# Altium footprint library smd-ipc.PCBLIB: 363 footprints (part 26 of 27) (continued)
## SQFP-S-44X44-568 [mm] (continued)
Top Overlay:
  circle w0.254: c-19.7,-20.2 r0.75
  lines w0.203: -21.77,-21.76 21.76,-21.76 21.76,21.76 -21.77,21.76 -21.77,-21.76
Mechanical 16:
  drawing of 572 lines, arcs and shapes, not listed
Mechanical 27:
  lines w0.2: -24.4,-24.4 -24.4,24.4 24.4,24.4 24.4,-24.4 -24.4,-24.4

## SQFP-S-44X44-576 [mm]
pads (576):
  rect 0.17x1.6 smd: 1(-21.45,-22.6) 2(-21.15,-22.6) 3(-20.85,-22.6) 4(-20.55,-22.6) 5(-20.25,-22.6) 6(-19.95,-22.6) 7(-19.65,-22.6) 8(-19.35,-22.6) 9(-19.05,-22.6) 10(-18.75,-22.6) 11(-18.45,-22.6) 12(-18.15,-22.6) 13(-17.85,-22.6) 14(-17.55,-22.6) 15(-17.25,-22.6) 16(-16.95,-22.6) 17(-16.65,-22.6) 18(-16.35,-22.6) 19(-16.05,-22.6) 20(-15.75,-22.6) 21(-15.45,-22.6) 22(-15.15,-22.6) 23(-14.85,-22.6) 24(-14.55,-22.6) 25(-14.25,-22.6) 26(-13.95,-22.6) 27(-13.65,-22.6) 28(-13.35,-22.6) 29(-13.05,-22.6) 30(-12.75,-22.6) 31(-12.45,-22.6) 32(-12.15,-22.6) 33(-11.85,-22.6) 34(-11.55,-22.6) 35(-11.25,-22.6) 36(-10.95,-22.6) 37(-10.65,-22.6) 38(-10.35,-22.6) 39(-10.05,-22.6) 40(-9.75,-22.6) 41(-9.45,-22.6) 42(-9.15,-22.6) 43(-8.85,-22.6) 44(-8.55,-22.6) 45(-8.25,-22.6) 46(-7.95,-22.6) 47(-7.65,-22.6) 48(-7.35,-22.6) 49(-7.05,-22.6) 50(-6.75,-22.6) 51(-6.45,-22.6) 52(-6.15,-22.6) 53(-5.85,-22.6) 54(-5.55,-22.6) 55(-5.25,-22.6) 56(-4.95,-22.6) 57(-4.65,-22.6) 58(-4.35,-22.6) 59(-4.05,-22.6) 60(-3.75,-22.6) 61(-3.45,-22.6) 62(-3.15,-22.6) 63(-2.85,-22.6) 64(-2.55,-22.6) 65(-2.25,-22.6) 66(-1.95,-22.6) 67(-1.65,-22.6) 68(-1.35,-22.6) 69(-1.05,-22.6) 70(-0.75,-22.6) 71(-0.45,-22.6) 72(-0.15,-22.6) 73(0.15,-22.6) 74(0.45,-22.6) 75(0.75,-22.6) 76(1.05,-22.6) 77(1.35,-22.6) 78(1.65,-22.6) 79(1.95,-22.6) 80(2.25,-22.6) 81(2.55,-22.6) 82(2.85,-22.6) 83(3.15,-22.6) 84(3.45,-22.6) 85(3.75,-22.6) 86(4.05,-22.6) 87(4.35,-22.6) 88(4.65,-22.6) 89(4.95,-22.6) 90(5.25,-22.6) 91(5.55,-22.6) 92(5.85,-22.6) 93(6.15,-22.6) 94(6.45,-22.6) 95(6.75,-22.6) 96(7.05,-22.6) 97(7.35,-22.6) 98(7.65,-22.6) 99(7.95,-22.6) 100(8.25,-22.6) 101(8.55,-22.6) 102(8.85,-22.6) 103(9.15,-22.6) 104(9.45,-22.6) 105(9.75,-22.6) 106(10.05,-22.6) 107(10.35,-22.6) 108(10.65,-22.6) 109(10.95,-22.6) 110(11.25,-22.6) 111(11.55,-22.6) 112(11.85,-22.6) 113(12.15,-22.6) 114(12.45,-22.6) 115(12.75,-22.6) 116(13.05,-22.6) 117(13.35,-22.6) 118(13.65,-22.6) 119(13.95,-22.6) 120(14.25,-22.6) 121(14.55,-22.6) 122(14.85,-22.6) 123(15.15,-22.6) 124(15.45,-22.6) 125(15.75,-22.6) 126(16.05,-22.6) 127(16.35,-22.6) 128(16.65,-22.6) 129(16.95,-22.6) 130(17.25,-22.6) 131(17.55,-22.6) 132(17.85,-22.6) 133(18.15,-22.6) 134(18.45,-22.6) 135(18.75,-22.6) 136(19.05,-22.6) 137(19.35,-22.6) 138(19.65,-22.6) 139(19.95,-22.6) 140(20.25,-22.6) 141(20.55,-22.6) 142(20.85,-22.6) 143(21.15,-22.6) 144(21.45,-22.6) 289(21.45,22.6) 290(21.15,22.6) 291(20.85,22.6) 292(20.55,22.6) 293(20.25,22.6) 294(19.95,22.6) 295(19.65,22.6) 296(19.35,22.6) 297(19.05,22.6) 298(18.75,22.6) 299(18.45,22.6) 300(18.15,22.6) 301(17.85,22.6) 302(17.55,22.6) 303(17.25,22.6) 304(16.95,22.6) 305(16.65,22.6) 306(16.35,22.6) 307(16.05,22.6) 308(15.75,22.6) 309(15.45,22.6) 310(15.15,22.6) 311(14.85,22.6) 312(14.55,22.6) 313(14.25,22.6) 314(13.95,22.6) 315(13.65,22.6) 316(13.35,22.6) 317(13.05,22.6) 318(12.75,22.6) 319(12.45,22.6) 320(12.15,22.6) 321(11.85,22.6) 322(11.55,22.6) 323(11.25,22.6) 324(10.95,22.6) 325(10.65,22.6) 326(10.35,22.6) 327(10.05,22.6) 328(9.75,22.6) 329(9.45,22.6) 330(9.15,22.6) 331(8.85,22.6) 332(8.55,22.6) 333(8.25,22.6) 334(7.95,22.6) 335(7.65,22.6) 336(7.35,22.6) 337(7.05,22.6) 338(6.75,22.6) 339(6.45,22.6) 340(6.15,22.6) 341(5.85,22.6) 342(5.55,22.6) 343(5.25,22.6) 344(4.95,22.6) 345(4.65,22.6) 346(4.35,22.6) 347(4.05,22.6) 348(3.75,22.6) 349(3.45,22.6) 350(3.15,22.6) 351(2.85,22.6) 352(2.55,22.6) 353(2.25,22.6) 354(1.95,22.6) 355(1.65,22.6) 356(1.35,22.6) 357(1.05,22.6) 358(0.75,22.6) 359(0.45,22.6) 360(0.15,22.6) 361(-0.15,22.6) 362(-0.45,22.6) 363(-0.75,22.6) 364(-1.05,22.6) 365(-1.35,22.6) 366(-1.65,22.6) 367(-1.95,22.6) 368(-2.25,22.6) 369(-2.55,22.6) 370(-2.85,22.6) 371(-3.15,22.6) 372(-3.45,22.6) 373(-3.75,22.6) 374(-4.05,22.6) 375(-4.35,22.6) 376(-4.65,22.6) 377(-4.95,22.6) 378(-5.25,22.6) 379(-5.55,22.6) 380(-5.85,22.6) 381(-6.15,22.6) 382(-6.45,22.6) 383(-6.75,22.6) 384(-7.05,22.6) 385(-7.35,22.6) 386(-7.65,22.6) 387(-7.95,22.6) 388(-8.25,22.6) 389(-8.55,22.6) 390(-8.85,22.6) 391(-9.15,22.6) 392(-9.45,22.6) 393(-9.75,22.6) 394(-10.05,22.6) 395(-10.35,22.6) 396(-10.65,22.6) 397(-10.95,22.6) 398(-11.25,22.6) 399(-11.55,22.6) 400(-11.85,22.6) 401(-12.15,22.6) 402(-12.45,22.6) 403(-12.75,22.6) 404(-13.05,22.6) 405(-13.35,22.6) 406(-13.65,22.6) 407(-13.95,22.6) 408(-14.25,22.6) 409(-14.55,22.6) 410(-14.85,22.6) 411(-15.15,22.6) 412(-15.45,22.6) 413(-15.75,22.6) 414(-16.05,22.6) 415(-16.35,22.6) 416(-16.65,22.6) 417(-16.95,22.6) 418(-17.25,22.6) 419(-17.55,22.6) 420(-17.85,22.6) 421(-18.15,22.6) 422(-18.45,22.6) 423(-18.75,22.6) 424(-19.05,22.6) 425(-19.35,22.6) 426(-19.65,22.6) 427(-19.95,22.6) 428(-20.25,22.6) 429(-20.55,22.6) 430(-20.85,22.6) 431(-21.15,22.6) 432(-21.45,22.6)
  rect 1.6x0.17 smd: 145(22.6,-21.45) 146(22.6,-21.15) 147(22.6,-20.85) 148(22.6,-20.55) 149(22.6,-20.25) 150(22.6,-19.95) 151(22.6,-19.65) 152(22.6,-19.35) 153(22.6,-19.05) 154(22.6,-18.75) 155(22.6,-18.45) 156(22.6,-18.15) 157(22.6,-17.85) 158(22.6,-17.55) 159(22.6,-17.25) 160(22.6,-16.95) 161(22.6,-16.65) 162(22.6,-16.35) 163(22.6,-16.05) 164(22.6,-15.75) 165(22.6,-15.45) 166(22.6,-15.15) 167(22.6,-14.85) 168(22.6,-14.55) 169(22.6,-14.25) 170(22.6,-13.95) 171(22.6,-13.65) 172(22.6,-13.35) 173(22.6,-13.05) 174(22.6,-12.75) 175(22.6,-12.45) 176(22.6,-12.15) 177(22.6,-11.85) 178(22.6,-11.55) 179(22.6,-11.25) 180(22.6,-10.95) 181(22.6,-10.65) 182(22.6,-10.35) 183(22.6,-10.05) 184(22.6,-9.75) 185(22.6,-9.45) 186(22.6,-9.15) 187(22.6,-8.85) 188(22.6,-8.55) 189(22.6,-8.25) 190(22.6,-7.95) 191(22.6,-7.65) 192(22.6,-7.35) 193(22.6,-7.05) 194(22.6,-6.75) 195(22.6,-6.45) 196(22.6,-6.15) 197(22.6,-5.85) 198(22.6,-5.55) 199(22.6,-5.25) 200(22.6,-4.95) 201(22.6,-4.65) 202(22.6,-4.35) 203(22.6,-4.05) 204(22.6,-3.75) 205(22.6,-3.45) 206(22.6,-3.15) 207(22.6,-2.85) 208(22.6,-2.55) 209(22.6,-2.25) 210(22.6,-1.95) 211(22.6,-1.65) 212(22.6,-1.35) 213(22.6,-1.05) 214(22.6,-0.75) 215(22.6,-0.45) 216(22.6,-0.15) 217(22.6,0.15) 218(22.6,0.45) 219(22.6,0.75) 220(22.6,1.05) 221(22.6,1.35) 222(22.6,1.65) 223(22.6,1.95) 224(22.6,2.25) 225(22.6,2.55) 226(22.6,2.85) 227(22.6,3.15) 228(22.6,3.45) 229(22.6,3.75) 230(22.6,4.05) 231(22.6,4.35) 232(22.6,4.65) 233(22.6,4.95) 234(22.6,5.25) 235(22.6,5.55) 236(22.6,5.85) 237(22.6,6.15) 238(22.6,6.45) 239(22.6,6.75) 240(22.6,7.05) 241(22.6,7.35) 242(22.6,7.65) 243(22.6,7.95) 244(22.6,8.25) 245(22.6,8.55) 246(22.6,8.85) 247(22.6,9.15) 248(22.6,9.45) 249(22.6,9.75) 250(22.6,10.05) 251(22.6,10.35) 252(22.6,10.65) 253(22.6,10.95) 254(22.6,11.25) 255(22.6,11.55) 256(22.6,11.85) 257(22.6,12.15) 258(22.6,12.45) 259(22.6,12.75) 260(22.6,13.05) 261(22.6,13.35) 262(22.6,13.65) 263(22.6,13.95) 264(22.6,14.25) 265(22.6,14.55) 266(22.6,14.85) 267(22.6,15.15) 268(22.6,15.45) 269(22.6,15.75) 270(22.6,16.05) 271(22.6,16.35) 272(22.6,16.65) 273(22.6,16.95) 274(22.6,17.25) 275(22.6,17.55) 276(22.6,17.85) 277(22.6,18.15) 278(22.6,18.45) 279(22.6,18.75) 280(22.6,19.05) 281(22.6,19.35) 282(22.6,19.65) 283(22.6,19.95) 284(22.6,20.25) 285(22.6,20.55) 286(22.6,20.85) 287(22.6,21.15) 288(22.6,21.45) 433(-22.6,21.45) 434(-22.6,21.15) 435(-22.6,20.85) 436(-22.6,20.55) 437(-22.6,20.25) 438(-22.6,19.95) 439(-22.6,19.65) 440(-22.6,19.35) 441(-22.6,19.05) 442(-22.6,18.75) 443(-22.6,18.45) 444(-22.6,18.15) 445(-22.6,17.85) 446(-22.6,17.55) 447(-22.6,17.25) 448(-22.6,16.95) 449(-22.6,16.65) 450(-22.6,16.35) 451(-22.6,16.05) 452(-22.6,15.75) 453(-22.6,15.45) 454(-22.6,15.15) 455(-22.6,14.85) 456(-22.6,14.55) 457(-22.6,14.25) 458(-22.6,13.95) 459(-22.6,13.65) 460(-22.6,13.35) 461(-22.6,13.05) 462(-22.6,12.75) 463(-22.6,12.45) 464(-22.6,12.15) 465(-22.6,11.85) 466(-22.6,11.55) 467(-22.6,11.25) 468(-22.6,10.95) 469(-22.6,10.65) 470(-22.6,10.35) 471(-22.6,10.05) 472(-22.6,9.75) 473(-22.6,9.45) 474(-22.6,9.15) 475(-22.6,8.85) 476(-22.6,8.55) 477(-22.6,8.25) 478(-22.6,7.95) 479(-22.6,7.65) 480(-22.6,7.35) 481(-22.6,7.05) 482(-22.6,6.75) 483(-22.6,6.45) 484(-22.6,6.15) 485(-22.6,5.85) 486(-22.6,5.55) 487(-22.6,5.25) 488(-22.6,4.95) 489(-22.6,4.65) 490(-22.6,4.35) 491(-22.6,4.05) 492(-22.6,3.75) 493(-22.6,3.45) 494(-22.6,3.15) 495(-22.6,2.85) 496(-22.6,2.55) 497(-22.6,2.25) 498(-22.6,1.95) 499(-22.6,1.65) 500(-22.6,1.35) 501(-22.6,1.05) 502(-22.6,0.75) 503(-22.6,0.45) 504(-22.6,0.15) 505(-22.6,-0.15) 506(-22.6,-0.45) 507(-22.6,-0.75) 508(-22.6,-1.05) 509(-22.6,-1.35) 510(-22.6,-1.65) 511(-22.6,-1.95) 512(-22.6,-2.25) 513(-22.6,-2.55) 514(-22.6,-2.85) 515(-22.6,-3.15) 516(-22.6,-3.45) 517(-22.6,-3.75) 518(-22.6,-4.05) 519(-22.6,-4.35) 520(-22.6,-4.65) 521(-22.6,-4.95) 522(-22.6,-5.25) 523(-22.6,-5.55) 524(-22.6,-5.85) 525(-22.6,-6.15) 526(-22.6,-6.45) 527(-22.6,-6.75) 528(-22.6,-7.05) 529(-22.6,-7.35) 530(-22.6,-7.65) 531(-22.6,-7.95) 532(-22.6,-8.25) 533(-22.6,-8.55) 534(-22.6,-8.85) 535(-22.6,-9.15) 536(-22.6,-9.45) 537(-22.6,-9.75) 538(-22.6,-10.05) 539(-22.6,-10.35) 540(-22.6,-10.65) 541(-22.6,-10.95) 542(-22.6,-11.25) 543(-22.6,-11.55) 544(-22.6,-11.85) 545(-22.6,-12.15) 546(-22.6,-12.45) 547(-22.6,-12.75) 548(-22.6,-13.05) 549(-22.6,-13.35) 550(-22.6,-13.65) 551(-22.6,-13.95) 552(-22.6,-14.25) 553(-22.6,-14.55) 554(-22.6,-14.85) 555(-22.6,-15.15) 556(-22.6,-15.45) 557(-22.6,-15.75) 558(-22.6,-16.05) 559(-22.6,-16.35) 560(-22.6,-16.65) 561(-22.6,-16.95) 562(-22.6,-17.25) 563(-22.6,-17.55) 564(-22.6,-17.85) 565(-22.6,-18.15) 566(-22.6,-18.45) 567(-22.6,-18.75) 568(-22.6,-19.05) 569(-22.6,-19.35) 570(-22.6,-19.65) 571(-22.6,-19.95) 572(-22.6,-20.25) 573(-22.6,-20.55) 574(-22.6,-20.85) 575(-22.6,-21.15) 576(-22.6,-21.45)
Top Overlay:
  circle w0.254: c-19.7,-20.2 r0.75
  lines w0.203: -21.77,-21.76 21.76,-21.76 21.76,21.76 -21.77,21.76 -21.77,-21.76
Mechanical 16:
  drawing of 580 lines, arcs and shapes, not listed
Mechanical 27:
  lines w0.2: -24.4,-24.4 -24.4,24.4 24.4,24.4 24.4,-24.4 -24.4,-24.4

## SSO48 [mm]
pads (48):
  rect 0.4x2.2 smd: 1(-7.303,-4.7) 2(-6.668,-4.7) 3(-6.033,-4.7) 4(-5.398,-4.7) 5(-4.763,-4.7) 6(-4.128,-4.7) 7(-3.493,-4.7) 8(-2.858,-4.7) 9(-2.223,-4.7) 10(-1.588,-4.7) 11(-0.953,-4.7) 12(-0.318,-4.7) 13(0.318,-4.7) 14(0.953,-4.7) 15(1.588,-4.7) 16(2.223,-4.7) 17(2.858,-4.7) 18(3.493,-4.7) 19(4.128,-4.7) 20(4.763,-4.7) 21(5.398,-4.7) 22(6.033,-4.7) 23(6.668,-4.7) 24(7.303,-4.7) 25(7.303,4.7) 26(6.668,4.7) 27(6.033,4.7) 28(5.398,4.7) 29(4.763,4.7) 30(4.128,4.7) 31(3.493,4.7) 32(2.858,4.7) 33(2.223,4.7) 34(1.588,4.7) 35(0.953,4.7) 36(0.318,4.7) 37(-0.318,4.7) 38(-0.953,4.7) 39(-1.588,4.7) 40(-2.223,4.7) 41(-2.858,4.7) 42(-3.493,4.7) 43(-4.128,4.7) 44(-4.763,4.7) 45(-5.398,4.7) 46(-6.033,4.7) 47(-6.668,4.7) 48(-7.303,4.7)
Mechanical 16:
  rectangle: -7.453,-5.33 -7.152,-3.8
  rectangle: -6.818,-5.33 -6.517,-3.8
  rectangle: -6.183,-5.33 -5.882,-3.8
  rectangle: -5.548,-5.33 -5.247,-3.8
  rectangle: -4.913,-5.33 -4.612,-3.8
  rectangle: -4.278,-5.33 -3.977,-3.8
  rectangle: -3.643,-5.33 -3.342,-3.8
  rectangle: -3.008,-5.33 -2.707,-3.8
  rectangle: -2.373,-5.33 -2.072,-3.8
  rectangle: -1.738,-5.33 -1.437,-3.8
  rectangle: -1.103,-5.33 -0.802,-3.8
  rectangle: -0.468,-5.33 -0.167,-3.8
  rectangle: 0.167,-5.33 0.468,-3.8
  rectangle: 0.802,-5.33 1.103,-3.8
  rectangle: 1.437,-5.33 1.738,-3.8
  rectangle: 2.072,-5.33 2.373,-3.8
  rectangle: 2.707,-5.33 3.008,-3.8
  rectangle: 3.342,-5.33 3.643,-3.8
  rectangle: 3.977,-5.33 4.278,-3.8
  rectangle: 4.612,-5.33 4.913,-3.8
  rectangle: 5.247,-5.33 5.548,-3.8
  rectangle: 5.882,-5.33 6.183,-3.8
  rectangle: 6.517,-5.33 6.818,-3.8
  rectangle: 7.152,-5.33 7.453,-3.8
  rectangle: 7.152,3.8 7.453,5.33
  rectangle: 6.517,3.8 6.818,5.33
  rectangle: 5.882,3.8 6.183,5.33
  rectangle: 5.247,3.8 5.548,5.33
  rectangle: 4.612,3.8 4.913,5.33
  rectangle: 3.977,3.8 4.278,5.33
  rectangle: 3.342,3.8 3.643,5.33
  rectangle: 2.707,3.8 3.008,5.33
  rectangle: 2.072,3.8 2.373,5.33
  rectangle: 1.437,3.8 1.738,5.33
  rectangle: 0.802,3.8 1.103,5.33
  rectangle: 0.167,3.8 0.468,5.33
  rectangle: -0.468,3.8 -0.167,5.33
  rectangle: -1.103,3.8 -0.802,5.33
  rectangle: -1.738,3.8 -1.437,5.33
  rectangle: -2.373,3.8 -2.072,5.33
  rectangle: -3.008,3.8 -2.707,5.33
  rectangle: -3.643,3.8 -3.342,5.33
  rectangle: -4.278,3.8 -3.977,5.33
  rectangle: -4.913,3.8 -4.612,5.33
  rectangle: -5.548,3.8 -5.247,5.33
  rectangle: -6.183,3.8 -5.882,5.33
  rectangle: -6.818,3.8 -6.517,5.33
  rectangle: -7.453,3.8 -7.152,5.33
  lines w0.203: -7.9,-3.2 -7.9,-3.7 7.9,-3.7 7.9,-3.2 ; -7.9,-3.2 -7.9,3.7 7.9,3.7 7.9,-3.2 ; -7.9,-3.2 7.9,-3.2
Mechanical 27:
  lines w0.2: -8.395,-5.9 8.395,-5.9 8.395,5.9 -8.395,5.9 -8.395,-5.9

## SSO56 [mm]
pads (56):
  rect 0.4x2.2 smd: 1(-8.573,-4.7) 2(-7.938,-4.7) 3(-7.303,-4.7) 4(-6.668,-4.7) 5(-6.033,-4.7) 6(-5.398,-4.7) 7(-4.763,-4.7) 8(-4.128,-4.7) 9(-3.493,-4.7) 10(-2.858,-4.7) 11(-2.223,-4.7) 12(-1.588,-4.7) 13(-0.953,-4.7) 14(-0.318,-4.7) 15(0.318,-4.7) 16(0.953,-4.7) 17(1.588,-4.7) 18(2.223,-4.7) 19(2.858,-4.7) 20(3.493,-4.7) 21(4.128,-4.7) 22(4.763,-4.7) 23(5.398,-4.7) 24(6.033,-4.7) 25(6.668,-4.7) 26(7.303,-4.7) 27(7.938,-4.7) 28(8.573,-4.7) 29(8.573,4.7) 30(7.938,4.7) 31(7.303,4.7) 32(6.668,4.7) 33(6.033,4.7) 34(5.398,4.7) 35(4.763,4.7) 36(4.128,4.7) 37(3.493,4.7) 38(2.858,4.7) 39(2.223,4.7) 40(1.588,4.7) 41(0.953,4.7) 42(0.318,4.7) 43(-0.318,4.7) 44(-0.953,4.7) 45(-1.588,4.7) 46(-2.223,4.7) 47(-2.858,4.7) 48(-3.493,4.7) 49(-4.128,4.7) 50(-4.763,4.7) 51(-5.398,4.7) 52(-6.033,4.7) 53(-6.668,4.7) 54(-7.303,4.7) 55(-7.938,4.7) 56(-8.573,4.7)
Mechanical 16:
  rectangle: -8.723,-5.33 -8.422,-3.8
  rectangle: -8.088,-5.33 -7.787,-3.8
  rectangle: -7.453,-5.33 -7.152,-3.8
  rectangle: -6.818,-5.33 -6.517,-3.8
  rectangle: -6.183,-5.33 -5.882,-3.8
  rectangle: -5.548,-5.33 -5.247,-3.8
  rectangle: -4.913,-5.33 -4.612,-3.8
  rectangle: -4.278,-5.33 -3.977,-3.8
  rectangle: -3.643,-5.33 -3.342,-3.8
  rectangle: -3.008,-5.33 -2.707,-3.8
  rectangle: -2.373,-5.33 -2.072,-3.8
  rectangle: -1.738,-5.33 -1.437,-3.8
  rectangle: -1.103,-5.33 -0.802,-3.8
  rectangle: -0.468,-5.33 -0.167,-3.8
  rectangle: 0.167,-5.33 0.468,-3.8
  rectangle: 0.802,-5.33 1.103,-3.8
  rectangle: 1.437,-5.33 1.738,-3.8
  rectangle: 2.072,-5.33 2.373,-3.8
  rectangle: 2.707,-5.33 3.008,-3.8
  rectangle: 3.342,-5.33 3.643,-3.8
  rectangle: 3.977,-5.33 4.278,-3.8
  rectangle: 4.612,-5.33 4.913,-3.8
  rectangle: 5.247,-5.33 5.548,-3.8
  rectangle: 5.882,-5.33 6.183,-3.8
  rectangle: 6.517,-5.33 6.818,-3.8
  rectangle: 7.152,-5.33 7.453,-3.8
  rectangle: 7.787,-5.33 8.088,-3.8
  rectangle: 8.422,-5.33 8.723,-3.8
  rectangle: 8.422,3.8 8.723,5.33
  rectangle: 7.787,3.8 8.088,5.33
  rectangle: 7.152,3.8 7.453,5.33
  rectangle: 6.517,3.8 6.818,5.33
  rectangle: 5.882,3.8 6.183,5.33
  rectangle: 5.247,3.8 5.548,5.33
  rectangle: 4.612,3.8 4.913,5.33
  rectangle: 3.977,3.8 4.278,5.33
  rectangle: 3.342,3.8 3.643,5.33
  rectangle: 2.707,3.8 3.008,5.33
  rectangle: 2.072,3.8 2.373,5.33
  rectangle: 1.437,3.8 1.738,5.33
  rectangle: 0.802,3.8 1.103,5.33
  rectangle: 0.167,3.8 0.468,5.33
  rectangle: -0.468,3.8 -0.167,5.33
  rectangle: -1.103,3.8 -0.802,5.33
  rectangle: -1.738,3.8 -1.437,5.33
  rectangle: -2.373,3.8 -2.072,5.33
  rectangle: -3.008,3.8 -2.707,5.33
  rectangle: -3.643,3.8 -3.342,5.33
  rectangle: -4.278,3.8 -3.977,5.33
  rectangle: -4.913,3.8 -4.612,5.33
  rectangle: -5.548,3.8 -5.247,5.33
  rectangle: -6.183,3.8 -5.882,5.33
  rectangle: -6.818,3.8 -6.517,5.33
  rectangle: -7.453,3.8 -7.152,5.33
  rectangle: -8.088,3.8 -7.787,5.33
  rectangle: -8.723,3.8 -8.422,5.33
  lines w0.203: -9.17,-3.2 -9.17,-3.7 9.17,-3.7 9.17,-3.2 ; -9.17,-3.2 -9.17,3.7 9.17,3.7 9.17,-3.2 ; -9.17,-3.2 9.17,-3.2
Mechanical 27:
  lines w0.2: -9.395,-5.9 9.395,-5.9 9.395,5.9 -9.395,5.9 -9.395,-5.9

## SSO64 [mm]
pads (64):
  rect 0.5x2 smd: 1(-12.4,-6.7) 2(-11.6,-6.7) 3(-10.8,-6.7) 4(-10,-6.7) 5(-9.2,-6.7) 6(-8.4,-6.7) 7(-7.6,-6.7) 8(-6.8,-6.7) 9(-6,-6.7) 10(-5.2,-6.7) 11(-4.4,-6.7) 12(-3.6,-6.7) 13(-2.8,-6.7) 14(-2,-6.7) 15(-1.2,-6.7) 16(-0.4,-6.7) 17(0.4,-6.7) 18(1.2,-6.7) 19(2,-6.7) 20(2.8,-6.7) 21(3.6,-6.7) 22(4.4,-6.7) 23(5.2,-6.7) 24(6,-6.7) 25(6.8,-6.7) 26(7.6,-6.7) 27(8.4,-6.7) 28(9.2,-6.7) 29(10,-6.7) 30(10.8,-6.7) 31(11.6,-6.7) 32(12.4,-6.7) 33(12.4,6.7) 34(11.6,6.7) 35(10.8,6.7) 36(10,6.7) 37(9.2,6.7) 38(8.4,6.7) 39(7.6,6.7) 40(6.8,6.7) 41(6,6.7) 42(5.2,6.7) 43(4.4,6.7) 44(3.6,6.7) 45(2.8,6.7) 46(2,6.7) 47(1.2,6.7) 48(0.4,6.7) 49(-0.4,6.7) 50(-1.2,6.7) 51(-2,6.7) 52(-2.8,6.7) 53(-3.6,6.7) 54(-4.4,6.7) 55(-5.2,6.7) 56(-6,6.7) 57(-6.8,6.7) 58(-7.6,6.7) 59(-8.4,6.7) 60(-9.2,6.7) 61(-10,6.7) 62(-10.8,6.7) 63(-11.6,6.7) 64(-12.4,6.7)
Mechanical 16:
  rectangle: -12.62,-7.25 -12.18,-6.05
  rectangle: -11.82,-7.25 -11.38,-6.05
  rectangle: -11.02,-7.25 -10.58,-6.05
  rectangle: -10.22,-7.25 -9.78,-6.05
  rectangle: -9.42,-7.25 -8.98,-6.05
  rectangle: -8.62,-7.25 -8.18,-6.05
  rectangle: -7.82,-7.25 -7.38,-6.05
  rectangle: -7.02,-7.25 -6.58,-6.05
  rectangle: -6.22,-7.25 -5.78,-6.05
  rectangle: -5.42,-7.25 -4.98,-6.05
  rectangle: -4.62,-7.25 -4.18,-6.05
  rectangle: -3.82,-7.25 -3.38,-6.05
  rectangle: -3.02,-7.25 -2.58,-6.05
  rectangle: -2.22,-7.25 -1.78,-6.05
  rectangle: -1.42,-7.25 -0.98,-6.05
  rectangle: -0.62,-7.25 -0.18,-6.05
  rectangle: 0.18,-7.25 0.62,-6.05
  rectangle: 0.98,-7.25 1.42,-6.05
  rectangle: 1.78,-7.25 2.22,-6.05
  rectangle: 2.58,-7.25 3.02,-6.05
  rectangle: 3.38,-7.25 3.82,-6.05
  rectangle: 4.18,-7.25 4.62,-6.05
  rectangle: 4.98,-7.25 5.42,-6.05
  rectangle: 5.78,-7.25 6.22,-6.05
  rectangle: 6.58,-7.25 7.02,-6.05
  rectangle: 7.38,-7.25 7.82,-6.05
  rectangle: 8.18,-7.25 8.62,-6.05
  rectangle: 8.98,-7.25 9.42,-6.05
  rectangle: 9.78,-7.25 10.22,-6.05
  rectangle: 10.58,-7.25 11.02,-6.05
  rectangle: 11.38,-7.25 11.82,-6.05
  rectangle: 12.18,-7.25 12.62,-6.05
  rectangle: 12.18,6.05 12.62,7.25
  rectangle: 11.38,6.05 11.82,7.25
  rectangle: 10.58,6.05 11.02,7.25
  rectangle: 9.78,6.05 10.22,7.25
  rectangle: 8.98,6.05 9.42,7.25
  rectangle: 8.18,6.05 8.62,7.25
  rectangle: 7.38,6.05 7.82,7.25
  rectangle: 6.58,6.05 7.02,7.25
  rectangle: 5.78,6.05 6.22,7.25
  rectangle: 4.98,6.05 5.42,7.25
  rectangle: 4.18,6.05 4.62,7.25
  rectangle: 3.38,6.05 3.82,7.25
  rectangle: 2.58,6.05 3.02,7.25
  rectangle: 1.78,6.05 2.22,7.25
  rectangle: 0.98,6.05 1.42,7.25
  rectangle: 0.18,6.05 0.62,7.25
  rectangle: -0.62,6.05 -0.18,7.25
  rectangle: -1.42,6.05 -0.98,7.25
  rectangle: -2.22,6.05 -1.78,7.25
  rectangle: -3.02,6.05 -2.58,7.25
  rectangle: -3.82,6.05 -3.38,7.25
  rectangle: -4.62,6.05 -4.18,7.25
  rectangle: -5.42,6.05 -4.98,7.25
  rectangle: -6.22,6.05 -5.78,7.25
  rectangle: -7.02,6.05 -6.58,7.25
  rectangle: -7.82,6.05 -7.38,7.25
  rectangle: -8.62,6.05 -8.18,7.25
  rectangle: -9.42,6.05 -8.98,7.25
  rectangle: -10.22,6.05 -9.78,7.25
  rectangle: -11.02,6.05 -10.58,7.25
  rectangle: -11.82,6.05 -11.38,7.25
  rectangle: -12.62,6.05 -12.18,7.25
  lines w0.203: -13.12,-5.06 -13.12,-5.96 13.12,-5.96 13.12,-5.06 ; -13.12,-5.06 -13.12,5.96 13.12,5.96 13.12,-5.06 ; -13.12,-5.06 13.12,-5.06
Mechanical 27:
  lines w0.2: -13.395,-7.9 13.395,-7.9 13.395,7.9 -13.395,7.9 -13.395,-7.9

## TO252 [mm]
pads (3):
  rect 1x1.6 smd: 1(-2.28,-4.8) 2(2.28,-4.8)
  rect 5.4x6.2 smd: 3(0,2.5)
Top Overlay:
  rectangle: -0.432,-3.023 0.432,-2.261
  lines w0.203: -3.277,3.835 -3.277,-2.159 3.277,-2.159 3.277,3.835
Mechanical 16:
  rectangle: -2.718,-5.156 -1.854,-2.261
  rectangle: 1.854,-5.156 2.718,-2.261
  region: 0,0 0.254,0 0.254,0.254 0,0.254
  lines w0.203: -3.277,3.835 3.277,3.835 ; -2.565,3.937 -2.565,4.648 -2.108,5.105 2.108,5.105 2.565,4.648 2.565,3.937 -2.565,3.937
Mechanical 27:
  lines w0.051: -3.973,-5.983 3.973,-5.983 3.973,5.983 -3.973,5.983 -3.973,-5.983

## TO263 [mm]
pads (3):
  rect 1x3.4 smd: 1(-2.54,-6.6) 2(2.54,-6.6)
  rect 6.8x9.6 smd: 3(0,3.5)
Top Overlay:
  rectangle: -0.432,-2.643 0.432,-1.881
  rectangle: -2.99,-4.74 -2.09,-1.94
  rectangle: 2.09,-4.74 2.99,-1.94
  lines w0.203: -4.917,7.165 -4.917,-1.839 4.917,-1.839 4.917,7.165
Mechanical 16:
  rectangle: -3,-7.5 -2.1,-4.7
  rectangle: 2.1,-7.5 3,-4.7
  region: 0,0 0.254,0 0.254,0.254 0,0.254
  lines w0.203: -4.917,7.165 4.917,7.165 ; -2.565,7.267 -2.565,7.678 -2.108,8.135 2.108,8.135 2.565,7.678 2.565,7.267 -2.565,7.267
Mechanical 27:
  lines w0.051: -5.973,-8.983 5.973,-8.983 5.973,8.983 -5.973,8.983 -5.973,-8.983

## TO268 [mm]
pads (3):
  rect 1.4x3.4 smd: 1(-5.45,-8.2) 2(5.45,-8.2)
  rect 13x13 smd: 3(0,3.2)
Top Overlay:
  rectangle: -0.72,-6.85 0.72,-5.55
  lines w0.203: -7.857,7.835 -7.857,-5.549 7.857,-5.549 7.857,7.835
Top Solder:
  rectangle: -7,-3.7 7,10.1
Mechanical 16:
  rectangle: -6.15,-9.55 -4.75,-6.85
  rectangle: -6.15,-6.85 -4.75,-5.55
  rectangle: 4.75,-6.85 6.15,-5.55
  rectangle: 4.75,-9.55 6.15,-6.85
  region: 0,0 0.254,0 0.254,0.254 0,0.254
  lines w0.203: -7.858,7.835 7.858,7.835 ; -6.565,7.937 -6.565,8.978 -6.108,9.436 6.108,9.436 6.565,8.978 6.565,7.937 -6.565,7.937
Mechanical 27:
  lines w0.051: -8.473,-10.483 8.473,-10.483 8.473,10.483 -8.473,10.483 -8.473,-10.483

## TS-003 [mm]
pads (3):
  rect 1x1.6 smd: 1(-2.28,-4.8) 2(2.28,-4.8)
  rect 5.4x6.2 smd: 3(0,2.5)
Top Overlay:
  rectangle: -0.432,-3.023 0.432,-2.261
  lines w0.203: -3.277,3.835 -3.277,-2.159 3.277,-2.159 3.277,3.835
Mechanical 16:
  rectangle: -2.718,-5.156 -1.854,-2.261
  rectangle: 1.854,-5.156 2.718,-2.261
  region: 0,0 0.254,0 0.254,0.254 0,0.254
  lines w0.203: -3.277,3.835 3.277,3.835 ; -2.565,3.937 -2.565,4.648 -2.108,5.105 2.108,5.105 2.565,4.648 2.565,3.937 -2.565,3.937
Mechanical 27:
  lines w0.051: -3.973,-5.983 3.973,-5.983 3.973,5.983 -3.973,5.983 -3.973,-5.983

## TS-005 [mm]
pads (3):
  rect 1x3.4 smd: 1(-2.54,-6.6) 2(2.54,-6.6)
  rect 6.8x9.6 smd: 3(0,3.5)
Top Overlay:
  rectangle: -0.432,-2.643 0.432,-1.881
  rectangle: -2.99,-4.74 -2.09,-1.94
  rectangle: 2.09,-4.74 2.99,-1.94
  lines w0.203: -4.917,7.165 -4.917,-1.839 4.917,-1.839 4.917,7.165
Mechanical 16:
  rectangle: -3,-7.5 -2.1,-4.7
  rectangle: 2.1,-7.5 3,-4.7
  region: 0,0 0.254,0 0.254,0.254 0,0.254
  lines w0.152: -4.917,7.165 4.917,7.165 ; 2.6,7.2 2.6,7.3 ; 2.6,7.3 2.6,7.7 2.2,8.1 -2.2,8.1 -2.6,7.7 -2.6,7.3 2.6,7.3
Mechanical 27:
  lines w0.051: -5.973,-8.983 5.973,-8.983 5.973,8.983 -5.973,8.983 -5.973,-8.983

## TSOP6X14 [mm]
pads (16):
  rect 0.4x1.6 smd: 1(-2.275,-6.6) 2(-1.625,-6.6) 3(-0.975,-6.6) 4(-0.325,-6.6) 5(0.325,-6.6) 6(0.975,-6.6) 7(1.625,-6.6) 8(2.275,-6.6) 9(2.275,6.6) 10(1.625,6.6) 11(0.975,6.6) 12(0.325,6.6) 13(-0.325,6.6) 14(-0.975,6.6) 15(-1.625,6.6) 16(-2.275,6.6)
Top Overlay:
  text "1" at -2.481,-5.73 h1.57
Mechanical 16:
  rectangle: -2.475,-7.1 -2.075,-6.28
  rectangle: -1.825,-7.1 -1.425,-6.28
  rectangle: -1.175,-7.1 -0.775,-6.28
  rectangle: -0.525,-7.1 -0.125,-6.28
  rectangle: 0.125,-7.1 0.525,-6.28
  rectangle: 0.775,-7.1 1.175,-6.28
  rectangle: 1.425,-7.1 1.825,-6.28
  rectangle: 2.075,-7.1 2.475,-6.28
  rectangle: 2.075,6.28 2.475,7.1
  rectangle: 1.425,6.28 1.825,7.1
  rectangle: 0.775,6.28 1.175,7.1
  rectangle: 0.125,6.28 0.525,7.1
  rectangle: -0.525,6.28 -0.125,7.1
  rectangle: -1.175,6.28 -0.775,7.1
  rectangle: -1.825,6.28 -1.425,7.1
  rectangle: -2.475,6.28 -2.075,7.1
  lines w0.203: -2.995,-6.195 2.995,-6.195 2.995,6.195 -2.995,6.195 -2.995,-6.195
Mechanical 27:
  lines w0.2: -3.4,-7.9 -3.4,7.9 3.4,7.9 3.4,-7.9 -3.4,-7.9

## TSOP6X16 [mm]
pads (24):
  rect 0.3x1.6 smd: 1(-2.75,-7.6) 2(-2.25,-7.6) 3(-1.75,-7.6) 4(-1.25,-7.6) 5(-0.75,-7.6) 6(-0.25,-7.6) 7(0.25,-7.6) 8(0.75,-7.6) 9(1.25,-7.6) 10(1.75,-7.6) 11(2.25,-7.6) 12(2.75,-7.6) 13(2.75,7.6) 14(2.25,7.6) 15(1.75,7.6) 16(1.25,7.6) 17(0.75,7.6) 18(0.25,7.6) 19(-0.25,7.6) 20(-0.75,7.6) 21(-1.25,7.6) 22(-1.75,7.6) 23(-2.25,7.6) 24(-2.75,7.6)
Top Overlay:
  text "1" at -2.731,-6.48 h0.86
Mechanical 16:
  rectangle: -2.9,-8.1 -2.6,-7.25
  rectangle: -2.4,-8.1 -2.1,-7.25
  rectangle: -1.9,-8.1 -1.6,-7.25
  rectangle: -1.4,-8.1 -1.1,-7.25
  rectangle: -0.9,-8.1 -0.6,-7.25
  rectangle: -0.4,-8.1 -0.1,-7.25
  rectangle: 0.1,-8.1 0.4,-7.25
  rectangle: 0.6,-8.1 0.9,-7.25
  rectangle: 1.1,-8.1 1.4,-7.25
  rectangle: 1.6,-8.1 1.9,-7.25
  rectangle: 2.1,-8.1 2.4,-7.25
  rectangle: 2.6,-8.1 2.9,-7.25
  rectangle: 2.6,7.25 2.9,8.1
  rectangle: 2.1,7.25 2.4,8.1
  rectangle: 1.6,7.25 1.9,8.1
  rectangle: 1.1,7.25 1.4,8.1
  rectangle: 0.6,7.25 0.9,8.1
  rectangle: 0.1,7.25 0.4,8.1
  rectangle: -0.4,7.25 -0.1,8.1
  rectangle: -0.9,7.25 -0.6,8.1
  rectangle: -1.4,7.25 -1.1,8.1
  rectangle: -1.9,7.25 -1.6,8.1
  rectangle: -2.4,7.25 -2.1,8.1
  rectangle: -2.9,7.25 -2.6,8.1
  lines w0.203: -2.995,-7.195 2.995,-7.195 2.995,7.195 -2.995,7.195 -2.995,-7.195
Mechanical 27:
  lines w0.2: -3.4,-8.9 -3.4,8.9 3.4,8.9 3.4,-8.9 -3.4,-8.9